# Altium footprint library VESC_MotorController.PcbLib: 146 footprints (part 10 of 10)
Each footprint in its own frame and in the unit in brackets; x right, y up, seen from the top. Pads: shape width x height; smd on the part's side, far side on the other; paste and mask are expansions set on the pad; w line width, h text height; cw(c..) or ccw(c..) is an arc to the next point about the centre after c.
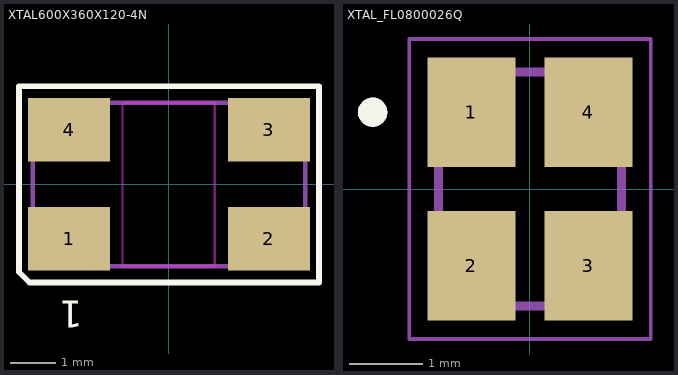
[diagram p9: the footprints below, top view; thin cyan lines are the x and y axes]

## XTAL600X360X120-4N [mm] "ABMM2-8.000MHZ-D1-T"
height 1.2
pads (4):
  rect 1.8x1.4 smd mask+0.051: 1(-2.2,-1.2) 2(2.2,-1.2) 3(2.2,1.2) 4(-2.2,1.2)
Top Overlay:
  lines w0.127: -3.302,-1.926 -3.069,-2.159 3.302,-2.159 3.302,2.159 -3.302,2.159 -3.302,-1.926
  text "1" at -1.895,-2.361 h1.02
Keep-Out Layer:
  lines w0.051: -1.024,-1.8 1.004,-1.8 1.004,1.8 -1.024,1.8 -1.024,-1.8
Mechanical 13:
  lines w0.102: -2.646,1.8 -3,1.8 ; -3,1.8 3,1.8 3,-1.8 -2.666,-1.8 -3,-1.466 -3,1.8
  text ".Designator" at 0.5,-0.014 h1.02
  text "1" at -1.991,-0.88 h1.02
  text "2" at 2.416,-0.953 h1.02
  text "3" at 2.416,1.534 h1.02
  text "4" at -1.863,1.428 h1.02
3D body "ABMM2.STEP": height 1.2, standoff 0, extent -3,-1.8 3,1.8

## XTAL_FL0800026Q [mm]
height 0.78
pads (4):
  rect 1.2x1.5 smd: 1(-0.8,1.05) 2(-0.8,-1.05) 3(0.8,-1.05) 4(0.8,1.05)
Top Overlay:
  circle w0.2: c-2.15,1.05 r0.1
Mechanical 13:
  circle w0.2: c-2.15,1.05 r0.1
  lines w0.127: -1.25,-1.6 1.25,-1.6 1.25,1.6 -1.25,1.6 -1.25,-1.6
Mechanical 15:
  lines w0.05: -1.65,-2.05 1.65,-2.05 1.65,2.05 -1.65,2.05 -1.65,-2.05
3D body "step_temp.STEP": height 0.78, standoff 0, extent -1.25,-1.6 1.25,1.6